# Altium integrated library Connector.IntLib: 152 symbols
Pins are listed as number, name and electrical type; pins without a type are passive.

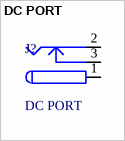
[diagram p0: symbol DC PORT]

## DC PORT
designator J?
Published: 17-Dec-2003; DatasheetDocument: 09-May-2002; Publisher: Altium Limited; ComponentLink1Description: Manufacturer Link; ComponentLink1URL: http://domino.kycon.com/internet/Products.html
footprint DC-002 (DC-002,3.5-1.1mm)
footprint DC-002-D (DC-002,3.5-1.1mm)
footprint DC-005
footprint DC-012
footprint DC-022
footprint PJ-010AH
pins: 1 (power), 2 (power), 3 (power)


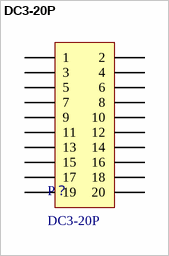
[diagram p1: symbol DC3-20P]

## DC3-20P
designator P？
footprint DC3-20P-2.54
pins: 1, 2, 3, 4, 5, 6, 7, 8, 9, 10, 11, 12, 13, 14, 15, 16, 17, 18, 19, 20


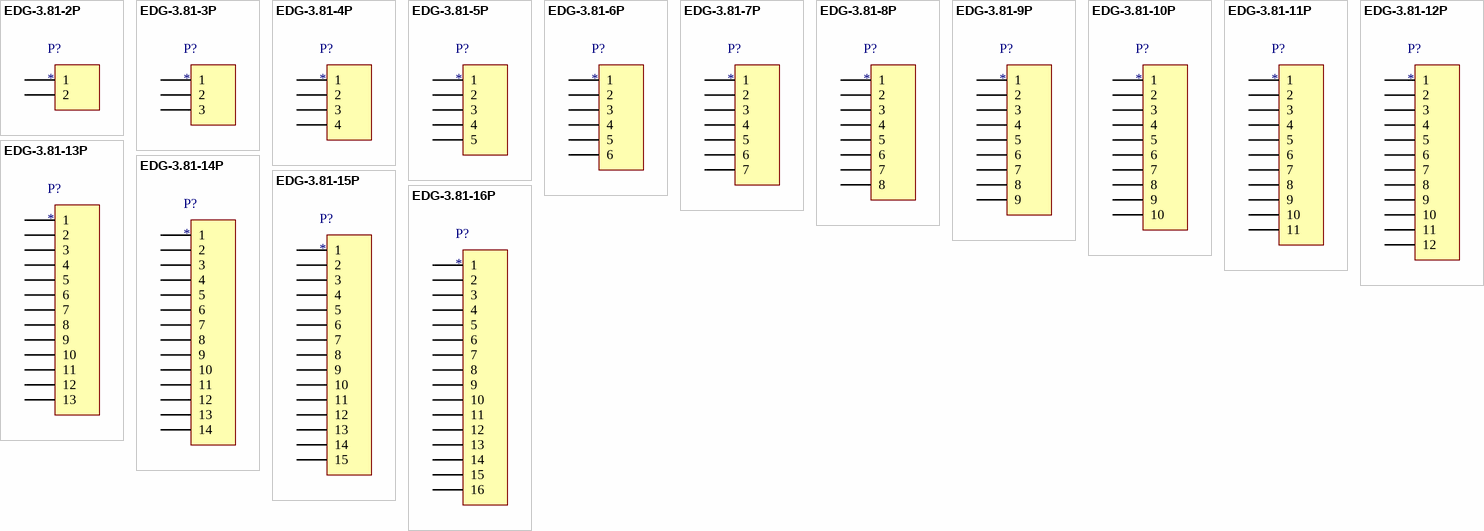
[diagram p2: symbols EDG-3.81-2P to EDG-3.81-16P]

## EDG-3.81-2P
designator P?
15/2EDG,2-Pin
footprint EDG-3.81_2P_AW
pins: 1, 2

## EDG-3.81-3P
designator P?
15/2EDG,3-Pin
footprint EDG-3.81_3P_AW
pins: 1, 2, 3

## EDG-3.81-4P
designator P?
15/2EDG,4-Pin
footprint EDG-3.81_4P_AW
pins: 1, 2, 3, 4

## EDG-3.81-5P
designator P?
15/2EDG,5-Pin
footprint EDG-3.81_5P_AW
pins: 1, 2, 3, 4, 5

## EDG-3.81-6P
designator P?
15/2EDG,6-Pin
footprint EDG-3.81_6P_AW
pins: 1, 2, 3, 4, 5, 6

## EDG-3.81-7P
designator P?
15/2EDG,7-Pin
footprint EDG-3.81_7P_AW
pins: 1, 2, 3, 4, 5, 6, 7

## EDG-3.81-8P
designator P?
15/2EDG,8-Pin
footprint EDG-3.81_8P_AW
pins: 1, 2, 3, 4, 5, 6, 7, 8

## EDG-3.81-9P
designator P?
15/2EDG,9-Pin
footprint EDG-3.81_9P_AW
pins: 1, 2, 3, 4, 5, 6, 7, 8, 9

## EDG-3.81-10P
designator P?
15/2EDG,10-Pin
footprint EDG-3.81_10P_AW
pins: 1, 2, 3, 4, 5, 6, 7, 8, 9, 10

## EDG-3.81-11P
designator P?
15/2EDG,11-Pin
footprint EDG-3.81_11P_AW
pins: 1, 2, 3, 4, 5, 6, 7, 8, 9, 10, 11

## EDG-3.81-12P
designator P?
15/2EDG,12-Pin
footprint EDG-3.81_12P_AW
pins: 1, 2, 3, 4, 5, 6, 7, 8, 9, 10, 11, 12

## EDG-3.81-13P
designator P?
15/2EDG,13-Pin
footprint EDG-3.81_13P_AW
pins: 1, 2, 3, 4, 5, 6, 7, 8, 9, 10, 11, 12, 13

## EDG-3.81-14P
designator P?
15/2EDG,14-Pin
footprint EDG-3.81_14P_AW
pins: 1, 2, 3, 4, 5, 6, 7, 8, 9, 10, 11, 12, 13, 14

## EDG-3.81-15P
designator P?
15/2EDG,15-Pin
footprint EDG-3.81_15P_AW
pins: 1, 2, 3, 4, 5, 6, 7, 8, 9, 10, 11, 12, 13, 14, 15

## EDG-3.81-16P
designator P?
15/2EDG,16-Pin
footprint EDG-3.81_16P_AW
pins: 1, 2, 3, 4, 5, 6, 7, 8, 9, 10, 11, 12, 13, 14, 15, 16


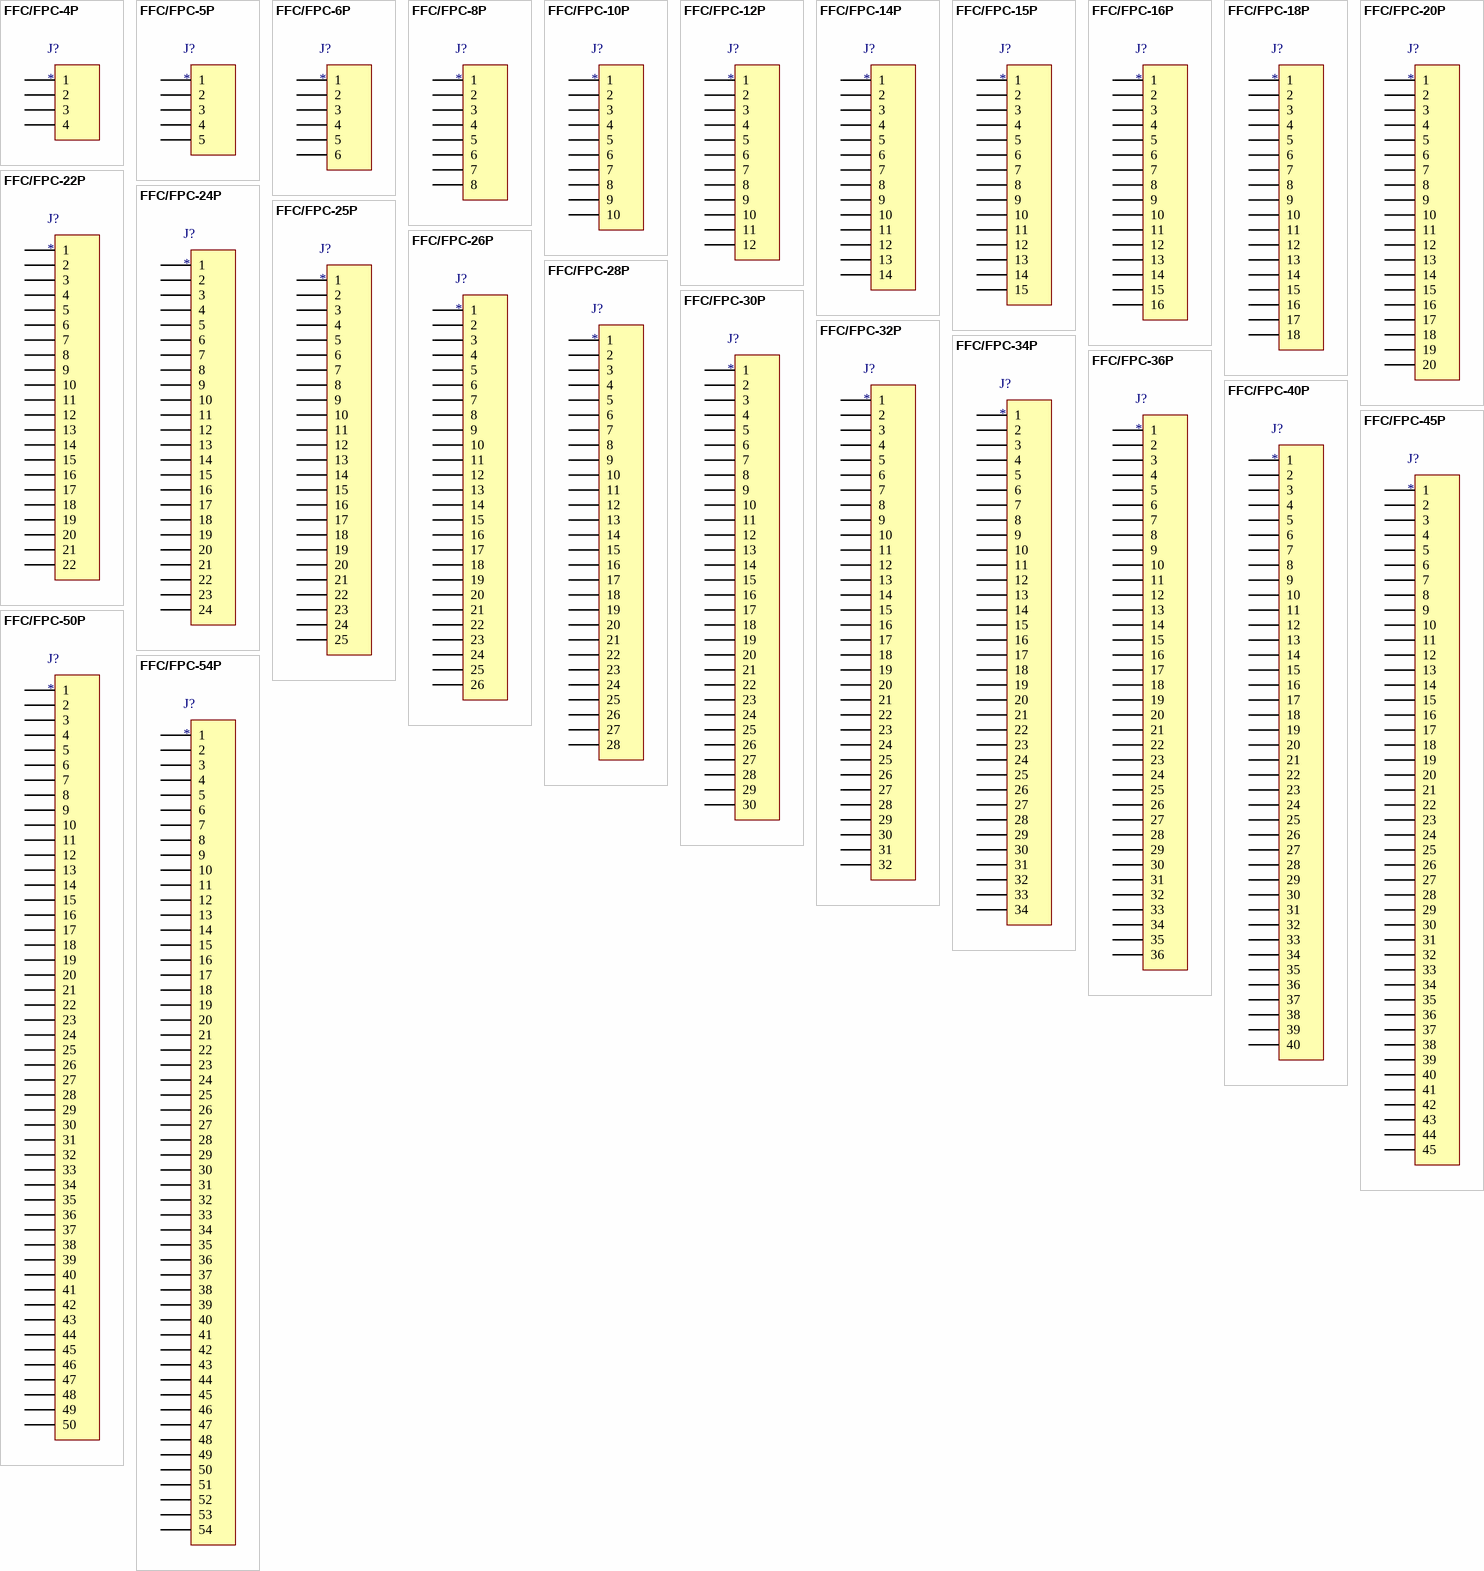
[diagram p3: symbols FFC/FPC-4P to FFC/FPC-54P]

## FFC/FPC-4P
designator J?
footprint FFC/FPC-1.0-4P_5.4W*2.5H
footprint FFC/FPC-0.5-4P_5.2W*2.0H
footprint FFC/FPC-0.5-4P_A_2.1W*4.5H
pins: 1, 2, 3, 4

## FFC/FPC-5P
designator J?
footprint FFC/FPC-1.0-5P_5.4W*2.5H
footprint FFC/FPC-0.5-5P_5.2W*2.0H
pins: 1, 2, 3, 4, 5

## FFC/FPC-6P
designator J?
footprint FFC/FPC-1.0-6P_5.4W*2.5H
footprint FFC/FPC-0.5-6P_5.2W*2.0H
footprint FFC/FPC-0.5-6P_A_2.1W*4.5H
pins: 1, 2, 3, 4, 5, 6

## FFC/FPC-8P
designator J?
footprint FFC/FPC-1.0-8P_5.4W*2.5H
footprint FFC/FPC-0.5-8P_5.2W*2.0H
footprint FFC/FPC-0.5-8P_A_2.1W*4.5H
pins: 1, 2, 3, 4, 5, 6, 7, 8

## FFC/FPC-10P
designator J?
footprint FFC/FPC-1.0-10P_5.4W*2.5H
footprint FFC/FPC-0.5-10P_5.2W*2.0H
footprint FFC/FPC-0.5-10P_A_2.1W*4.5H
pins: 1, 2, 3, 4, 5, 6, 7, 8, 9, 10

## FFC/FPC-12P
designator J?
footprint FFC/FPC-1.0-12P_5.4W*2.5H
footprint FFC/FPC-0.5-12P_5.2W*2.0H
footprint FFC/FPC-0.5-12P_A_2.1W*4.5H
pins: 1, 2, 3, 4, 5, 6, 7, 8, 9, 10, 11, 12

## FFC/FPC-14P
designator J?
footprint FFC/FPC-1.0-14P_5.4W*2.5H
footprint FFC/FPC-0.5-14P_5.2W*2.0H
footprint FFC/FPC-0.5-14P_A_2.1W*4.5H
pins: 1, 2, 3, 4, 5, 6, 7, 8, 9, 10, 11, 12, 13, 14

## FFC/FPC-15P
designator J?
footprint FFC/FPC-1.0-15P_5.4W*2.5H
pins: 1, 2, 3, 4, 5, 6, 7, 8, 9, 10, 11, 12, 13, 14, 15

## FFC/FPC-16P
designator J?
footprint FFC/FPC-1.0-16P_5.4W*2.5H
footprint FFC/FPC-0.5-16P_5.2W*2.0H
footprint FFC/FPC-0.5-16P_A_2.1W*4.5H
pins: 1, 2, 3, 4, 5, 6, 7, 8, 9, 10, 11, 12, 13, 14, 15, 16

## FFC/FPC-18P
designator J?
footprint FFC/FPC-1.0-18P_5.4W*2.5H
footprint FFC/FPC-0.5-18P_5.2W*2.0H
footprint FFC/FPC-0.5-18P_A_2.1W*4.5H
pins: 1, 2, 3, 4, 5, 6, 7, 8, 9, 10, 11, 12, 13, 14, 15, 16, 17, 18

## FFC/FPC-20P
designator J?
footprint FFC/FPC-1.0-20P_5.4W*2.5H
footprint FFC/FPC-0.5-20P_5.2W*2.0H
footprint FFC/FPC-0.5-20P_A_2.1W*4.5H
pins: 1, 2, 3, 4, 5, 6, 7, 8, 9, 10, 11, 12, 13, 14, 15, 16, 17, 18, 19, 20

## FFC/FPC-22P
designator J?
footprint FFC/FPC-1.0-22P_5.4W*2.5H
footprint FFC/FPC-0.5-22P_5.2W*2.0H
footprint FFC/FPC-0.5-22P_A_2.1W*4.5H
pins: 1, 2, 3, 4, 5, 6, 7, 8, 9, 10, 11, 12, 13, 14, 15, 16, 17, 18, 19, 20, 21, 22

## FFC/FPC-24P
designator J?
footprint FFC/FPC-1.0-24P_5.4W*2.5H
footprint FFC/FPC-0.5-24P_5.2W*2.0H
pins: 1, 2, 3, 4, 5, 6, 7, 8, 9, 10, 11, 12, 13, 14, 15, 16, 17, 18, 19, 20, 21, 22, 23, 24

## FFC/FPC-25P
designator J?
footprint FFC/FPC-1.0-25P_5.4W*2.5H
pins: 1, 2, 3, 4, 5, 6, 7, 8, 9, 10, 11, 12, 13, 14, 15, 16, 17, 18, 19, 20, 21, 22, 23, 24, 25

## FFC/FPC-26P
designator J?
footprint FFC/FPC-1.0-26P_5.4W*2.5H
footprint FFC/FPC-0.5-26P_5.2W*2.0H
footprint FFC/FPC-0.5-26P_A_2.1W*4.5H
pins: 1, 2, 3, 4, 5, 6, 7, 8, 9, 10, 11, 12, 13, 14, 15, 16, 17, 18, 19, 20, 21, 22, 23, 24, 25, 26

## FFC/FPC-28P
designator J?
footprint FFC/FPC-1.0-28P_5.4W*2.5H
footprint FFC/FPC-0.5-28P_A_2.1W*4.5H
pins: 1, 2, 3, 4, 5, 6, 7, 8, 9, 10, 11, 12, 13, 14, 15, 16, 17, 18, 19, 20, 21, 22, 23, 24, 25, 26, 27, 28

## FFC/FPC-30P
designator J?
footprint FFC/FPC-1.0-30P_5.4W*2.5H
footprint FFC/FPC-0.5-30P_5.2W*2.0H
footprint FFC/FPC-0.5-30P_A_2.1W*4.5H
pins: 1, 2, 3, 4, 5, 6, 7, 8, 9, 10, 11, 12, 13, 14, 15, 16, 17, 18, 19, 20, 21, 22, 23, 24, 25, 26, 27, 28, 29, 30

## FFC/FPC-32P
designator J?
footprint FFC/FPC-0.5-32P_5.2W*2.0H
footprint FFC/FPC-0.5-32P_A_2.1W*4.5H
pins: 1, 2, 3, 4, 5, 6, 7, 8, 9, 10, 11, 12, 13, 14, 15, 16, 17, 18, 19, 20, 21, 22, 23, 24, 25, 26, 27, 28, 29, 30, 31, 32

## FFC/FPC-34P
designator J?
footprint FFC/FPC-0.5-34P_5.2W*2.0H
footprint FFC/FPC-0.5-34P_A_2.1W*4.5H
pins: 1, 2, 3, 4, 5, 6, 7, 8, 9, 10, 11, 12, 13, 14, 15, 16, 17, 18, 19, 20, 21, 22, 23, 24, 25, 26, 27, 28, 29, 30, 31, 32, 33, 34

## FFC/FPC-36P
designator J?
footprint FFC/FPC-0.5-36P_5.2W*2.0H
footprint FFC/FPC-0.5-36P_A_2.1W*4.5H
pins: 1, 2, 3, 4, 5, 6, 7, 8, 9, 10, 11, 12, 13, 14, 15, 16, 17, 18, 19, 20, 21, 22, 23, 24, 25, 26, 27, 28, 29, 30, 31, 32, 33, 34, 35, 36

## FFC/FPC-40P
designator J?
footprint FFC/FPC-0.5-40P_5.2W*2.0H
footprint FFC/FPC-0.5-40P_A_2.1W*4.5H
pins: 1, 2, 3, 4, 5, 6, 7, 8, 9, 10, 11, 12, 13, 14, 15, 16, 17, 18, 19, 20, 21, 22, 23, 24, 25, 26, 27, 28, 29, 30, 31, 32, 33, 34, 35, 36, 37, 38, 39, 40

## FFC/FPC-45P
designator J?
footprint FFC/FPC-0.5-45P_A_2.1W*4.5H
pins: 1, 2, 3, 4, 5, 6, 7, 8, 9, 10, 11, 12, 13, 14, 15, 16, 17, 18, 19, 20, 21, 22, 23, 24, 25, 26, 27, 28, 29, 30, 31, 32, 33, 34, 35, 36, 37, 38, 39, 40, 41, 42, 43, 44, 45

## FFC/FPC-50P
designator J?
footprint FFC/FPC-0.5-50P_A_2.1W*4.5H
pins: 1, 2, 3, 4, 5, 6, 7, 8, 9, 10, 11, 12, 13, 14, 15, 16, 17, 18, 19, 20, 21, 22, 23, 24, 25, 26, 27, 28, 29, 30, 31, 32, 33, 34, 35, 36, 37, 38, 39, 40, 41, 42, 43, 44, 45, 46, 47, 48, 49, 50

## FFC/FPC-54P
designator J?
footprint FFC/FPC-0.5-54P_A_2.1W*4.5H
pins: 1, 2, 3, 4, 5, 6, 7, 8, 9, 10, 11, 12, 13, 14, 15, 16, 17, 18, 19, 20, 21, 22, 23, 24, 25, 26, 27, 28, 29, 30, 31, 32, 33, 34, 35, 36, 37, 38, 39, 40, 41, 42, 43, 44, 45, 46, 47, 48, 49, 50, 51, 52, 53, 54

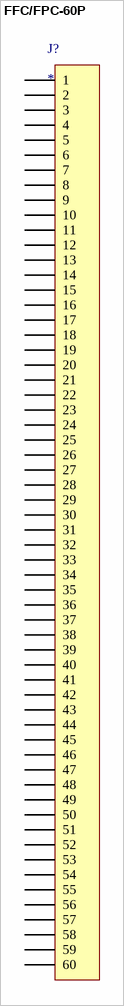
[diagram p4: symbol FFC/FPC-60P]

## FFC/FPC-60P
designator J?
footprint FFC/FPC-0.5-60P_A_2.1W*4.5H
pins: 1, 2, 3, 4, 5, 6, 7, 8, 9, 10, 11, 12, 13, 14, 15, 16, 17, 18, 19, 20, 21, 22, 23, 24, 25, 26, 27, 28, 29, 30, 31, 32, 33, 34, 35, 36, 37, 38, 39, 40, 41, 42, 43, 44, 45, 46, 47, 48, 49, 50, 51, 52, 53, 54, 55, 56, 57, 58, 59, 60


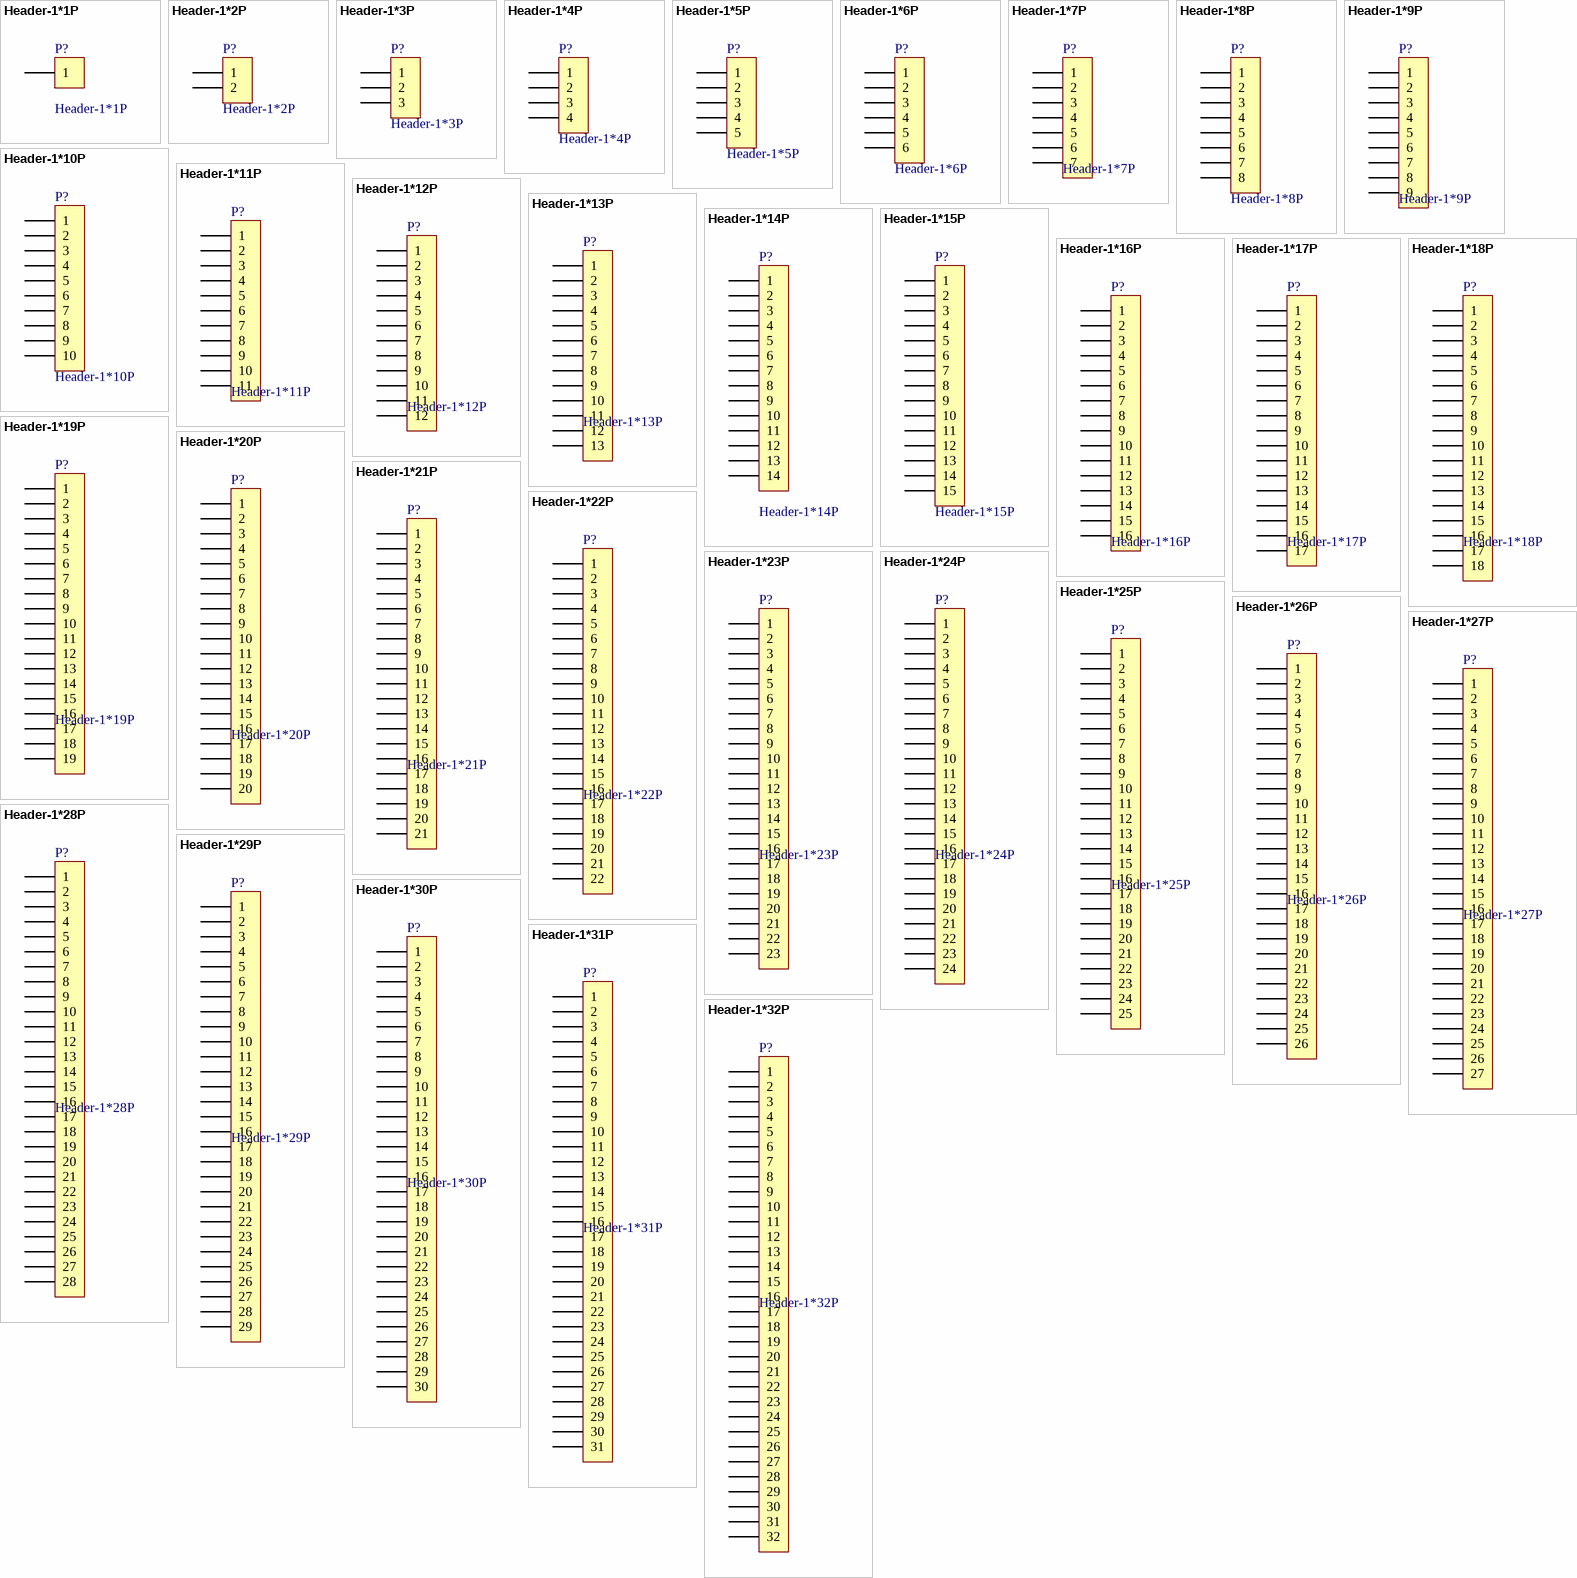
[diagram p5: symbols Header-1*1P to Header-1*32P]

## Header-1*1P
designator P?
Header, 1-Pin; LatestRevisionDate: 17-Jul-2002; LatestRevisionNote: Re-released for DXP Platform.; Publisher: Altium Limited
pins: 1

## Header-1*2P
designator P?
Header, 2-Pin; LatestRevisionDate: 17-Jul-2002; LatestRevisionNote: Re-released for DXP Platform.; Publisher: Altium Limited
footprint HEADER_1*2P_FEM_2.54_8.5H (Connector; Header; 2 Position)
footprint HEADER_1*2P_M_2.54_11.5H (Connector; Header; 2 Position)
footprint HEADER_1*2P_FEM_2.0_4.3H
footprint HEADER_1*2P_M_1.27_7.2H
footprint HEADER_1*2P_M_2.0_8.7H
pins: 1, 2

## Header-1*3P
designator P?
Header, 3-Pin; LatestRevisionDate: 17-Jul-2002; LatestRevisionNote: Re-released for DXP Platform.; Publisher: Altium Limited
footprint HEADER_1*3P_FEM_2.54_8.5H (Connector; Header; 3 Position)
footprint HEADER_1*3P_M_2.54_11.5H (Connector; Header; 3 Position)
footprint HEADER_1*3P_FEM_2.0_4.3H
footprint HEADER_1*3P_M_1.27_7.2H
footprint HEADER_1*3P_M_2.0_8.7H
pins: 1, 2, 3

## Header-1*4P
designator P?
Header, 4-Pin; LatestRevisionDate: 17-Jul-2002; LatestRevisionNote: Re-released for DXP Platform.; Publisher: Altium Limited
footprint HEADER_1*4P_FEM_2.54_8.5H
footprint HEADER_1*4P_M_2.54_11.5H
footprint HEADER_1*4P_FEM_2.0_4.3H
footprint HEADER_1*4P_M_1.27_7.2H
footprint HEADER_1*4P_M_2.0_8.7H
pins: 1, 2, 3, 4

## Header-1*5P
designator P?
Header, 5-Pin; LatestRevisionDate: 17-Jul-2002; LatestRevisionNote: Re-released for DXP Platform.; Publisher: Altium Limited
footprint HEADER_1*5P_FEM_2.54_8.5H (Connector; Header; 5 Position)
footprint HEADER_1*5P_M_2.54_11.5H (Connector; Header; 5 Position)
footprint HEADER_1*5P_FEM_2.0_4.3H
footprint HEADER_1*5P_M_2.0_8.7H
footprint HEADER_1*5P_M_1.27_7.2H
pins: 1, 2, 3, 4, 5

## Header-1*6P
designator P?
Header, 6-Pin; LatestRevisionDate: 17-Jul-2002; LatestRevisionNote: Re-released for DXP Platform.; Publisher: Altium Limited
footprint HEADER_1*6P_M_2.54_SMT_9.2H_5W
footprint HEADER_1*6P_FEM_2.0_4.3H
footprint HEADER_1*6P_M_1.27_7.2H
footprint HEADER_1*6P_M_2.0_8.7H
footprint HEADER_1*6P_M_2.54_11.5H (Connector; Header; 6 Position)
pins: 1, 2, 3, 4, 5, 6

## Header-1*7P
designator P?
Header, 7-Pin; LatestRevisionDate: 17-Jul-2002; LatestRevisionNote: Re-released for DXP Platform.; Publisher: Altium Limited
footprint HEADER_1*7P_FEM_2.0_4.3H
footprint HEADER_1*7P_M_1.27_7.2H
footprint HEADER_1*7P_M_2.0_8.7H
footprint HEADER_1*7P_M_2.54_11.5H (Connector; Header; 7 Position)
footprint HEADER_1*7P_FEM_2.54_8.5H (Connector; Header; 7 Position)
pins: 1, 2, 3, 4, 5, 6, 7

## Header-1*8P
designator P?
Header, 8-Pin; LatestRevisionDate: 17-Jul-2002; LatestRevisionNote: Re-released for DXP Platform.; Publisher: Altium Limited
footprint HEADER_1*8P_FEM_2.54_8.5H (Connector; Header; 8 Position)
footprint HEADER_1*8P_M_2.54_11.5H (Connector; Header; 8 Position)
footprint HEADER_1*8P_M_2.54_SMT_9.2H_5W
footprint HEADER_1*8P_FEM_2.0_4.3H
footprint HEADER_1*8P_M_1.27_7.2H
footprint HEADER_1*8P_M_2.0_8.7H
pins: 1, 2, 3, 4, 5, 6, 7, 8

## Header-1*9P
designator P?
Header, 9-Pin; LatestRevisionDate: 17-Jul-2002; LatestRevisionNote: Re-released for DXP Platform.; Publisher: Altium Limited
footprint HEADER_1*9P_FEM_2.54_8.5H (Connector; Header; 9 Position)
footprint HEADER_1*9P_M_1.27_7.2H
footprint HEADER_1*9P_M_2.0_8.7H
footprint HEADER_1*9P_M_2.54_11.5H (Connector; Header; 9 Position)
pins: 1, 2, 3, 4, 5, 6, 7, 8, 9

## Header-1*10P
designator P?
Header, 10-Pin; LatestRevisionDate: 17-Jul-2002; LatestRevisionNote: Re-released for DXP Platform.; Publisher: Altium Limited
footprint HEADER_1*10P_FEM_2.54_8.5H (Connector; Header; 10 Position)
footprint HEADER_1*10P_M_2.54_11.5H (Connector; Header; 10 Position)
footprint HEADER_1*10P_M_2.54_SMT_9.2H_5W
footprint HEADER_1*10P_FEM_2.0_4.3H
footprint HEADER_1*10P_M_1.27_7.2H
footprint HEADER_1*10P_M_2.0_8.7H
pins: 1, 2, 3, 4, 5, 6, 7, 8, 9, 10

## Header-1*11P
designator P?
Header, 11-Pin; LatestRevisionDate: 17-Jul-2002; LatestRevisionNote: Re-released for DXP Platform.; Publisher: Altium Limited
pins: 1, 2, 3, 4, 5, 6, 7, 8, 9, 10, 11

## Header-1*12P
designator P?
Header, 12-Pin; LatestRevisionDate: 17-Jul-2002; LatestRevisionNote: Re-released for DXP Platform.; Publisher: Altium Limited
footprint HEADER_1*12P_FEM_2.0_4.3H
footprint HEADER_1*12P_M_1.27_7.2H
footprint HEADER_1*12P_M_2.0_8.7H
footprint HEADER_1*12P_M_2.54_11.5H (Connector; Header; 12 Position)
pins: 1, 2, 3, 4, 5, 6, 7, 8, 9, 10, 11, 12

## Header-1*13P
designator P?
Header, 13-Pin; LatestRevisionDate: 17-Jul-2002; LatestRevisionNote: Re-released for DXP Platform.; Publisher: Altium Limited
pins: 1, 2, 3, 4, 5, 6, 7, 8, 9, 10, 11, 12, 13

## Header-1*14P
designator P?
Header, 14-Pin; LatestRevisionDate: 17-Jul-2002; LatestRevisionNote: Re-released for DXP Platform.; Publisher: Altium Limited
pins: 1, 2, 3, 4, 5, 6, 7, 8, 9, 10, 11, 12, 13, 14

## Header-1*15P
designator P?
Header, 15-Pin; LatestRevisionDate: 17-Jul-2002; LatestRevisionNote: Re-released for DXP Platform.; Publisher: Altium Limited
footprint HEADER_1*15P_M_2.54_11.5H (Connector; Header; 15 Position)
footprint HEADER_1*15P_FEM_2.0_4.3H
footprint HEADER_1*15P_M_1.27_7.2H
footprint HEADER_1*15P_M_2.0_8.7H
pins: 1, 2, 3, 4, 5, 6, 7, 8, 9, 10, 11, 12, 13, 14, 15

## Header-1*16P
designator P?
Header, 16-Pin; LatestRevisionDate: 17-Jul-2002; LatestRevisionNote: Re-released for DXP Platform.; Publisher: Altium Limited
pins: 1, 2, 3, 4, 5, 6, 7, 8, 9, 10, 11, 12, 13, 14, 15, 16

## Header-1*17P
designator P?
Header, 17-Pin; LatestRevisionDate: 17-Jul-2002; LatestRevisionNote: Re-released for DXP Platform.; Publisher: Altium Limited
pins: 1, 2, 3, 4, 5, 6, 7, 8, 9, 10, 11, 12, 13, 14, 15, 16, 17

## Header-1*18P
designator P?
Header, 18-Pin; LatestRevisionDate: 17-Jul-2002; LatestRevisionNote: Re-released for DXP Platform.; Publisher: Altium Limited
pins: 1, 2, 3, 4, 5, 6, 7, 8, 9, 10, 11, 12, 13, 14, 15, 16, 17, 18

## Header-1*19P
designator P?
Header, 19-Pin; LatestRevisionDate: 17-Jul-2002; LatestRevisionNote: Re-released for DXP Platform.; Publisher: Altium Limited
pins: 1, 2, 3, 4, 5, 6, 7, 8, 9, 10, 11, 12, 13, 14, 15, 16, 17, 18, 19

## Header-1*20P
designator P?
Header, 20-Pin; LatestRevisionDate: 17-Jul-2002; LatestRevisionNote: Re-released for DXP Platform.; Publisher: Altium Limited
footprint HEADER_1*20P_FEM_2.0_4.3H
footprint HEADER_1*20P_M_1.27_7.2H
footprint HEADER_1*20P_M_2.0_8.7H
pins: 1, 2, 3, 4, 5, 6, 7, 8, 9, 10, 11, 12, 13, 14, 15, 16, 17, 18, 19, 20

## Header-1*21P
designator P?
Header, 21-Pin
pins: 1, 2, 3, 4, 5, 6, 7, 8, 9, 10, 11, 12, 13, 14, 15, 16, 17, 18, 19, 20, 21

## Header-1*22P
designator P?
Header, 22-Pin
pins: 1, 2, 3, 4, 5, 6, 7, 8, 9, 10, 11, 12, 13, 14, 15, 16, 17, 18, 19, 20, 21, 22

## Header-1*23P
designator P?
Header, 23-Pin
pins: 1, 2, 3, 4, 5, 6, 7, 8, 9, 10, 11, 12, 13, 14, 15, 16, 17, 18, 19, 20, 21, 22, 23

## Header-1*24P
designator P?
Header, 24-Pin
pins: 1, 2, 3, 4, 5, 6, 7, 8, 9, 10, 11, 12, 13, 14, 15, 16, 17, 18, 19, 20, 21, 22, 23, 24

## Header-1*25P
designator P?
Header, 25-Pin
pins: 1, 2, 3, 4, 5, 6, 7, 8, 9, 10, 11, 12, 13, 14, 15, 16, 17, 18, 19, 20, 21, 22, 23, 24, 25

## Header-1*26P
designator P?
Header, 26-Pin
pins: 1, 2, 3, 4, 5, 6, 7, 8, 9, 10, 11, 12, 13, 14, 15, 16, 17, 18, 19, 20, 21, 22, 23, 24, 25, 26

## Header-1*27P
designator P?
Header, 27-Pin
pins: 1, 2, 3, 4, 5, 6, 7, 8, 9, 10, 11, 12, 13, 14, 15, 16, 17, 18, 19, 20, 21, 22, 23, 24, 25, 26, 27

## Header-1*28P
designator P?
Header, 28-Pin
pins: 1, 2, 3, 4, 5, 6, 7, 8, 9, 10, 11, 12, 13, 14, 15, 16, 17, 18, 19, 20, 21, 22, 23, 24, 25, 26, 27, 28

## Header-1*29P
designator P?
Header, 29-Pin
pins: 1, 2, 3, 4, 5, 6, 7, 8, 9, 10, 11, 12, 13, 14, 15, 16, 17, 18, 19, 20, 21, 22, 23, 24, 25, 26, 27, 28, 29

## Header-1*30P
designator P?
Header, 30-Pin
pins: 1, 2, 3, 4, 5, 6, 7, 8, 9, 10, 11, 12, 13, 14, 15, 16, 17, 18, 19, 20, 21, 22, 23, 24, 25, 26, 27, 28, 29, 30

## Header-1*31P
designator P?
Header, 31-Pin
pins: 1, 2, 3, 4, 5, 6, 7, 8, 9, 10, 11, 12, 13, 14, 15, 16, 17, 18, 19, 20, 21, 22, 23, 24, 25, 26, 27, 28, 29, 30, 31

## Header-1*32P
designator P?
Header, 32-Pin
pins: 1, 2, 3, 4, 5, 6, 7, 8, 9, 10, 11, 12, 13, 14, 15, 16, 17, 18, 19, 20, 21, 22, 23, 24, 25, 26, 27, 28, 29, 30, 31, 32
